# Altium footprint library GCMLibreriasPCB.PcbLib: 35 footprints (part 3 of 3)
Each footprint in its own frame and in the unit in brackets; x right, y up, seen from the top. Pads: shape width x height; smd on the part's side, far side on the other; paste and mask are expansions set on the pad; w line width, h text height; cw(c..) or ccw(c..) is an arc to the next point about the centre after c.
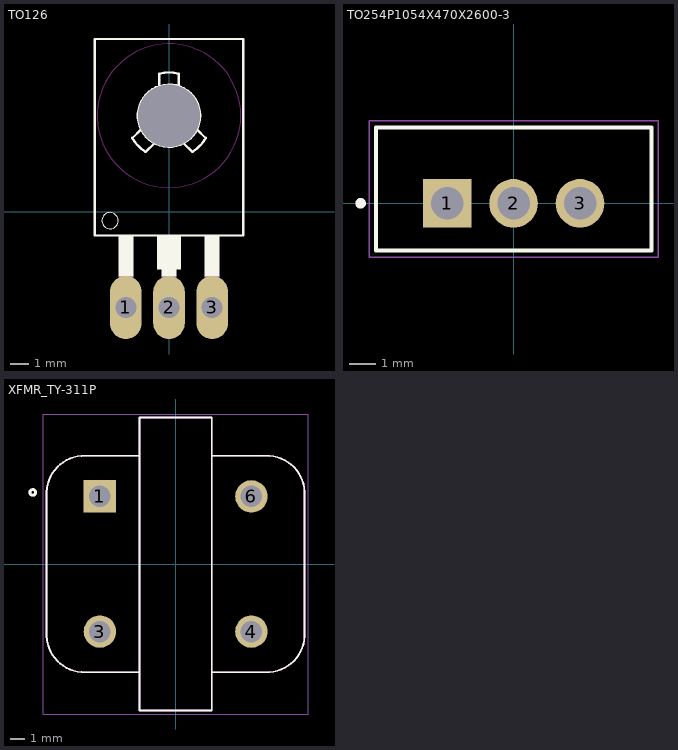
[diagram p2: the footprints below, top view; thin cyan lines are the x and y axes]

## TO126 [mil]
pads (4):
  oval 66x132 hole 44: 1(-90,-200) 2(0,-200) 3(90,-200)
  round 130 hole 130 unplated: ""(0,200)
Top Overlay:
  circle w0: c-123,-19 r17
  circle w5: c0,200 r65
  region: 25,-120 -25,-120 -25,-50 25,-50
  region: -75,-135 -105,-135 -105,-50 -75,-50
  region: 15,-135 -15,-135 -15,-50 15,-50
  region: 105,-135 75,-135 75,-50 105,-50
  lines w5: -77.15,153.65 ccw(c0,200) -49.02,124.52 ; -76.74,152.98 -58.22,171.09 ; -48.79,124.37 -30.26,142.47 ; -20.25,287.69 cw(c0,200) 20.25,287.69 ; -20,261.85 -20,287.75 ; 20,261.85 20,287.75 ; 30.26,142.47 48.79,124.37 ; 49.02,124.52 ccw(c0,200) 77.15,153.65 ; 58.22,171.09 76.74,152.98 ; -155,-50 -155,360 155,360 155,-50 -155,-50
Keep-Out Layer:
  circle w0: c0,200 r150
  circle w0: c0,200 r150
Mechanical 13:
  region: -75,-205 -105,-205 -105,-135 -75,-135
  region: 15,-205 -15,-205 -15,-135 15,-135
  region: 105,-205 75,-205 75,-135 105,-135
  text "1" at -100,-35 h50
  text "2" at -20,-35 h50
  text "3" at 70,-35 h50
3D body "step_temp.STEP": height 519.68, standoff -545.28, extent -149.61,-59.65 149.61,44.69

## TO254P1054X470X2600-3 [mm]
pads (3):
  rect 1.86x1.86 / inner round 1.86 / far side rect 1.86x1.86 hole 1.24: 1(-2.54,0)
  round 1.86 hole 1.24: 2(0,0) 3(2.54,0)
Top Overlay:
  circle w0.2: c-5.85,0 r0.1
  lines w0.152: -5.27,-1.8 5.27,-1.8 5.27,2.9 -5.27,2.9 -5.27,-1.8
Mechanical 13:
  lines w0.127: -5.27,-1.8 5.27,-1.8 5.27,2.9 -5.27,2.9 -5.27,-1.8
Mechanical 15:
  lines w0.05: -5.52,-2.052 -5.52,3.148 5.52,3.148 5.52,-2.052 -5.52,-2.052
3D body "step_temp.STEP": height 20.4, standoff -9.94, extent -5.08,-1.667 5.08,2.683

## XFMR_TY-311P [mil]
pads (4):
  rect 90x90 / inner round 90 / far side rect 90x90 hole 60: 1(-210,187.5)
  round 90 hole 60: 3(-210,-187.5) 4(210,-187.5) 6(210,187.5)
Top Overlay:
  circle w7.87: c-396.06,198.43 r7.87
  circle w7.87: c-396.06,198.43 r7.87
  circle w7.87: c-396.06,198.43 r7.87
  circle w7.87: c-396.06,198.43 r7.87
  lines w5: -357.5,-199.87 ccw(c-253.75,-196.25) -250.13,-300 ; -357.5,-199.87 ccw(c-253.75,-196.25) -250.13,-300 ; -357.5,-199.87 ccw(c-253.75,-196.25) -250.13,-300 ; -357.5,-199.87 ccw(c-253.75,-196.25) -250.13,-300 ; -357.5,199.87 cw(c-253.75,196.25) -250.13,300 ; -357.5,199.87 cw(c-253.75,196.25) -250.13,300 ; -357.5,199.87 cw(c-253.75,196.25) -250.13,300 ; -357.5,199.87 cw(c-253.75,196.25) -250.13,300 ; -100,-406 -100,-300 ; -100,-406 100,-406 ; -100,-406 -100,-300 ; -100,-406 100,-406 ; -100,-300 -250,-300 -100,-300 ; -100,-300 -100,300 ; -100,-300 -100,300 ; -100,300 -250,300 -100,300 ; -100,300 -100,406 ; -100,300 -100,406 ; -100,406 100,406 ; -100,406 100,406 ; 100,-406 100,-300 ; 100,-406 100,-300 ; 100,-300 250,-300 100,-300 ; 100,-300 100,300 ; 100,-300 100,300 ; 100,300 250,300 100,300 ; 100,300 100,406 ; 100,300 100,406 ; 250.13,-300 ccw(c253.75,-196.25) 357.5,-199.87 ; 250.13,-300 ccw(c253.75,-196.25) 357.5,-199.87 ; 250.13,-300 ccw(c253.75,-196.25) 357.5,-199.87 ; 250.13,-300 ccw(c253.75,-196.25) 357.5,-199.87 ; 250.13,300 cw(c253.75,196.25) 357.5,199.87 ; 250.13,300 cw(c253.75,196.25) 357.5,199.87 ; 250.13,300 cw(c253.75,196.25) 357.5,199.87 ; 250.13,300 cw(c253.75,196.25) 357.5,199.87 ; -357.5,-200 -357.5,200 -357.5,-200 ; 357.5,-200 357.5,200 357.5,-200
Mechanical 13:
  circle w7.87: c-396.06,198.43 r7.87
  circle w7.87: c-396.06,198.43 r7.87
  circle w7.87: c-396.06,198.43 r7.87
  circle w7.87: c-396.06,198.43 r7.87
  lines w5: -357.5,-199.87 ccw(c-253.75,-196.25) -250.13,-300 ; -357.5,-199.87 ccw(c-253.75,-196.25) -250.13,-300 ; -357.5,-199.87 ccw(c-253.75,-196.25) -250.13,-300 ; -357.5,-199.87 ccw(c-253.75,-196.25) -250.13,-300 ; -357.5,199.87 cw(c-253.75,196.25) -250.13,300 ; -357.5,199.87 cw(c-253.75,196.25) -250.13,300 ; -357.5,199.87 cw(c-253.75,196.25) -250.13,300 ; -357.5,199.87 cw(c-253.75,196.25) -250.13,300 ; -100,-406 -100,-300 ; -100,-406 100,-406 ; -100,-406 -100,-300 ; -100,-406 100,-406 ; -100,-300 -250,-300 -100,-300 ; -100,-300 -100,300 ; -100,-300 -100,300 ; -100,300 -250,300 -100,300 ; -100,300 -100,406 ; -100,300 -100,406 ; -100,406 100,406 ; -100,406 100,406 ; 100,-406 100,-300 ; 100,-406 100,-300 ; 100,-300 250,-300 100,-300 ; 100,-300 100,300 ; 100,-300 100,300 ; 100,300 250,300 100,300 ; 100,300 100,406 ; 100,300 100,406 ; 250.13,-300 ccw(c253.75,-196.25) 357.5,-199.87 ; 250.13,-300 ccw(c253.75,-196.25) 357.5,-199.87 ; 250.13,-300 ccw(c253.75,-196.25) 357.5,-199.87 ; 250.13,-300 ccw(c253.75,-196.25) 357.5,-199.87 ; 250.13,300 cw(c253.75,196.25) 357.5,199.87 ; 250.13,300 cw(c253.75,196.25) 357.5,199.87 ; 250.13,300 cw(c253.75,196.25) 357.5,199.87 ; 250.13,300 cw(c253.75,196.25) 357.5,199.87 ; -357.5,-200 -357.5,200 -357.5,-200 ; 357.5,-200 357.5,200 357.5,-200
Mechanical 15:
  lines w1.97: -367.34,-415.84 -367.34,415.84 367.34,415.84 367.34,-415.84 -367.34,-415.84
3D body "step_temp.STEP": height 650, standoff -240, extent -365,-406 365,406